# Altium footprint library JL_PCB.PCBLIB: 1129 footprints (part 51 of 72)
Each footprint in its own frame and in the unit in brackets; x right, y up, seen from the top. Pads: shape width x height; smd on the part's side, far side on the other; paste and mask are expansions set on the pad; w line width, h text height; cw(c..) or ccw(c..) is an arc to the next point about the centre after c.
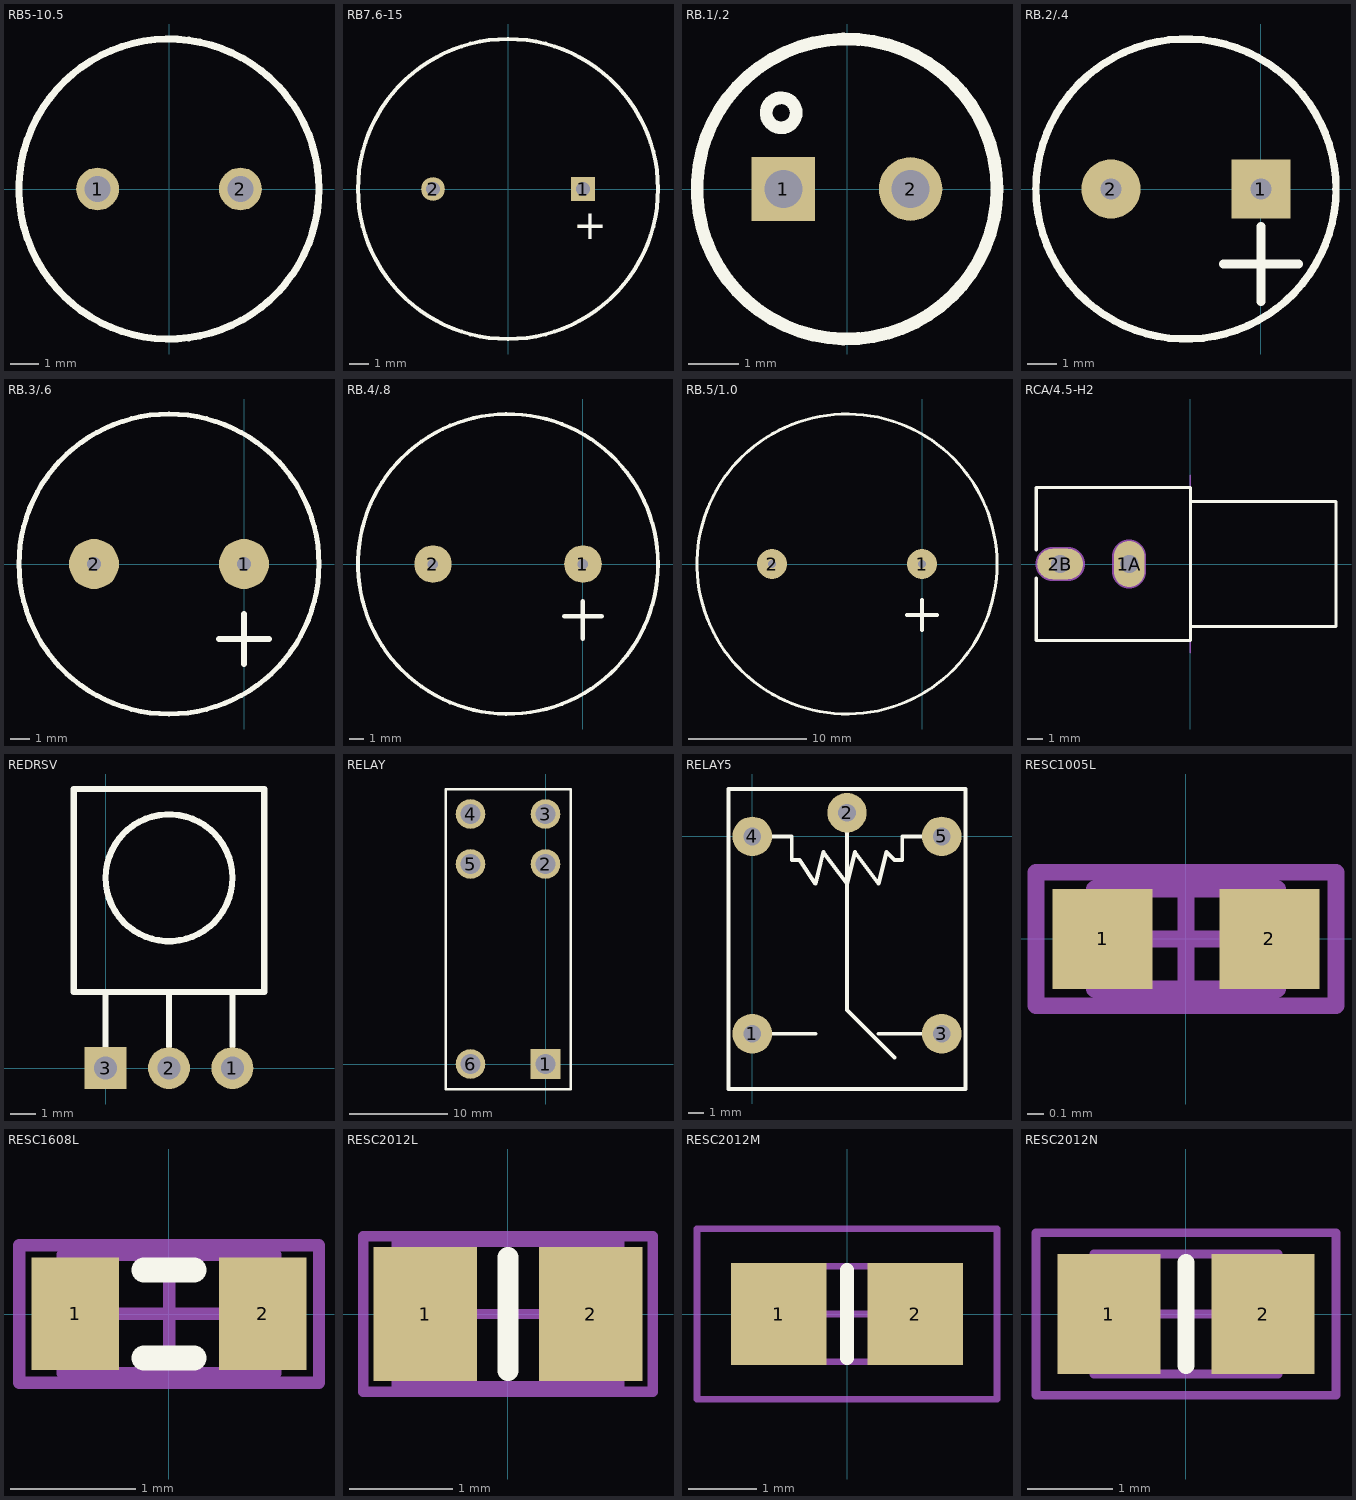
[diagram p50: the footprints below, top view; thin cyan lines are the x and y axes]

## RB5-10.5 [mm] "Motor, General Kind; 2 Leads"
pads (2):
  round 1.5 hole 0.9: 1(-2.5,0) 2(2.5,0)
TopOverlay:
  circle w0.25: c0,0 r5.25
Mechanical1:
  circle w0.02: c0,0 r5.25

## RB7.6-15 [mm] "Polarized Capacitor (Radial); 2 Leads"
pads (2):
  rect 1.2x1.2 hole 0.7: 1(3.81,0)
  round 1.2 hole 0.7: 2(-3.81,0)
TopOverlay:
  circle w0.2: c0,0 r7.62
  text "+" at 3.302,-2.54 h1.5

## RB.1/.2 [mil]
pads (2):
  rect 50x50 hole 30: 1(-50,0)
  round 50 hole 30: 2(50,0)
TopOverlay:
  circle w10: c0,0 r118.11
  circle w10: c-51.81,60 r11.81

## RB.2/.4 [mm]
pads (2):
  rect 2x2 hole 0.711: 1(0,0)
  round 2 hole 0.711: 2(-5.08,0)
TopOverlay:
  circle w0.254: c-2.54,0 r5.08
  lines w0.305: -1.27,-2.54 1.27,-2.54 ; 0,-3.81 0,-1.27
3D body "User Library-Cap electro 10x12_5x5_0mm.step": height 12.79, standoff -3.71, extent -7.591,-5.051 2.46,5

## RB.3/.6 [mil]
pads (2):
  round 100 hole 28: 1(0,0) 2(-300,0)
TopOverlay:
  circle w10: c-150,0 r300
  lines w12: -50,-150 50,-150 ; 0,-200 0,-100

## RB.4/.8 [mil]
pads (2):
  round 100 hole 28: 1(0,0) 2(-400,0)
TopOverlay:
  circle w10: c-200,0 r400
  lines w12: -50,-140 50,-140 ; 0,-200 0,-100

## RB.5/1.0 [mil]
pads (2):
  round 100 hole 28: 1(0,0) 2(-500,0)
TopOverlay:
  circle w10: c-250,0 r500
  lines w12: -50,-170 50,-170 ; 0,-220 0,-120

## RCA/4.5-H2 [mm] "Two Conductor Jack (RCA), Right Angle, Thru-Hole, Body 10 x 10 x 13 mm (WxTxH)"
height 13
pads (2):
  oval 2x3 hole 1.2: 1A(-4,0)
  oval 3x2 hole 1.2: 2B(-8.496,0)
TopOverlay:
  lines w0.2: -10.075,5 -0.018,5 ; -10.057,-0.92 -10.057,-5 0,-5 0,5 ; -10.057,0.92 -10.057,5 ; 0,-4.065 9.5,-4.065 9.5,4.065 0,4.065
Mechanical1:
  lines w0.1: 0,-5.8 0,5.8
  lines w1.2: -8.996,0 -7.996,0 ; -4,-0.5 -4,0.5
  text "PCB Edge" at -0.333,-4.618 h0.25
  text "Alert PCB fab to slot details" at -10.057,7.842 h0.3
  text "Slot 1.2x2.2mm, PTH" at -10.057,7.342 h0.3
  text "Assign keep-out area to slot" at -10.057,8.342 h0.3
  text "Mech 1 - Slot cut-out" at -10.057,6.842 h0.3
  text "Mech 2 - Clearance, move to internal plane if present" at -10.057,6.342 h0.3
Mechanical2:
  lines w2.216: -8.996,0 -7.996,0 ; -4,-0.5 -4,0.5

## REDRSV [mil]
pads (3):
  round 66 hole 36: 1(200,0) 2(100,0)
  rect 66x66 hole 36: 3(0,0)
TopOverlay:
  circle w10: c100,300 r100
  lines w10: 0,35 0,120 ; 100,35 100,120 ; 200,35 200,120 ; 0,120 -50,120 -50,440 250,440 250,120 0,120

## RELAY [mm]
pads (6):
  rect 3x3 hole 2: 1(0,0)
  round 3 hole 2: 2(0,20.32) 3(0,25.4) 4(-7.62,25.4) 5(-7.62,20.32) 6(-7.62,0)
TopOverlay:
  lines w0.254: -10.16,-2.54 2.54,-2.54 2.54,27.94 -10.16,27.94 -10.16,-2.54

## RELAY5 [mil]
pads (5):
  round 100 hole 45: 1(0,-500) 2(240,60) 3(480,-500) 4(0,0) 5(480,0)
TopOverlay:
  lines w10: 0,-500 160,-500 ; 0,0 100,0 100,-60 120,-60 160,-120 180,-40 240,-120 260,-40 320,-120 340,-40 360,-60 380,-60 380,0 480,0 ; 240,60 240,-440 360,-560 ; 320,-500 480,-500 ; -60,-640 540,-640 540,120 -60,120 -60,0 -60,-640

## RESC1005L [mm] "Chip Resistor, Body 1.1x0.5mm, IPC High Density"
height 2.54
pads (2):
  rect 0.6x0.6 smd: 1(-0.5,0) 2(0.5,0)
Mechanical13:
  lines w0.1: -0.55,-0.3 -0.55,0.3 0.55,0.3 0.55,-0.3 -0.55,-0.3
Mechanical15:
  lines w0.1: -0.3,0 0.3,0 ; 0,-0.3 0,0.3 ; -0.9,-0.4 -0.9,0.4 0.9,0.4 0.9,-0.4 -0.9,-0.4
3D body: height 2.54, standoff 0, extent -0.55,-0.3 0.55,0.3

## RESC1608L [mm] "Chip Resistor, Body 1.6x0.8mm, IPC High Density"
height 0.9
pads (2):
  rect 0.7x0.9 smd: 1(-0.75,0) 2(0.75,0)
TopOverlay:
  lines w0.2: -0.2,-0.35 0.2,-0.35 ; -0.2,0.35 0.2,0.35
Mechanical13:
  lines w0.1: -0.85,-0.475 -0.85,0.475 0.85,0.475 0.85,-0.475 -0.85,-0.475
Mechanical15:
  lines w0.1: -0.475,0 0.475,0 ; 0,-0.475 0,0.475 ; -1.2,-0.55 -1.2,0.55 1.2,0.55 1.2,-0.55 -1.2,-0.55
3D body: height 0.9, standoff 0, extent -0.85,-0.475 0.85,0.475

## RESC2012L [mm] "Chip Resistor, Body 2.0x1.3mm, IPC High Density"
height 2.54
pads (2):
  rect 1x1.3 smd: 1(-0.8,0) 2(0.8,0)
TopOverlay:
  lines w0.2: 0,-0.55 0,0.55
Mechanical13:
  lines w0.1: -1.075,-0.7 -1.075,0.7 1.075,0.7 1.075,-0.7 -1.075,-0.7
Mechanical15:
  lines w0.1: -0.5,0 0.5,0 ; 0,-0.5 0,0.5 ; -1.4,-0.75 -1.4,0.75 1.4,0.75 1.4,-0.75 -1.4,-0.75
3D body: height 2.54, standoff 0, extent -1.075,-0.7 1.075,0.7

## RESC2012M [mm] "Chip Resistor, Body 2.0x1.2mm, IPC Low Density"
height 0.7
pads (2):
  rect 1.4x1.5 smd: 1(-1,0) 2(1,0)
TopOverlay:
  lines w0.2: 0,-0.65 0,0.65
Mechanical13:
  lines w0.1: -1.075,-0.7 -1.075,0.7 1.075,0.7 1.075,-0.7 -1.075,-0.7
Mechanical15:
  lines w0.1: -0.5,0 0.5,0 ; 0,-0.5 0,0.5 ; -2.2,-1.25 -2.2,1.25 2.2,1.25 2.2,-1.25 -2.2,-1.25
3D body: height 0.7, standoff 0, extent -1.075,-0.7 1.075,0.7

## RESC2012N [mm] "Chip Resistor, Body 2.0x1.2mm, IPC Medium Density"
height 0.7
pads (2):
  rect 1.2x1.4 smd: 1(-0.9,0) 2(0.9,0)
TopOverlay:
  lines w0.2: 0,-0.6 0,0.6
Mechanical13:
  lines w0.1: -1.075,-0.7 1.075,-0.7 1.075,0.7 -1.075,0.7 -1.075,-0.7
Mechanical15:
  lines w0.1: -0.5,0 0.5,0 ; 0,-0.5 0,0.5 ; -1.75,-0.95 1.75,-0.95 1.75,0.95 -1.75,0.95 -1.75,-0.95
3D body: height 0.7, standoff 0, extent -1.075,-0.7 1.075,0.7